# Altium footprint library L14.PcbLib: 12 footprints
Each footprint in its own frame and in the unit in brackets; x right, y up, seen from the top. Pads: shape width x height; smd on the part's side, far side on the other; paste and mask are expansions set on the pad; w line width, h text height; cw(c..) or ccw(c..) is an arc to the next point about the centre after c.
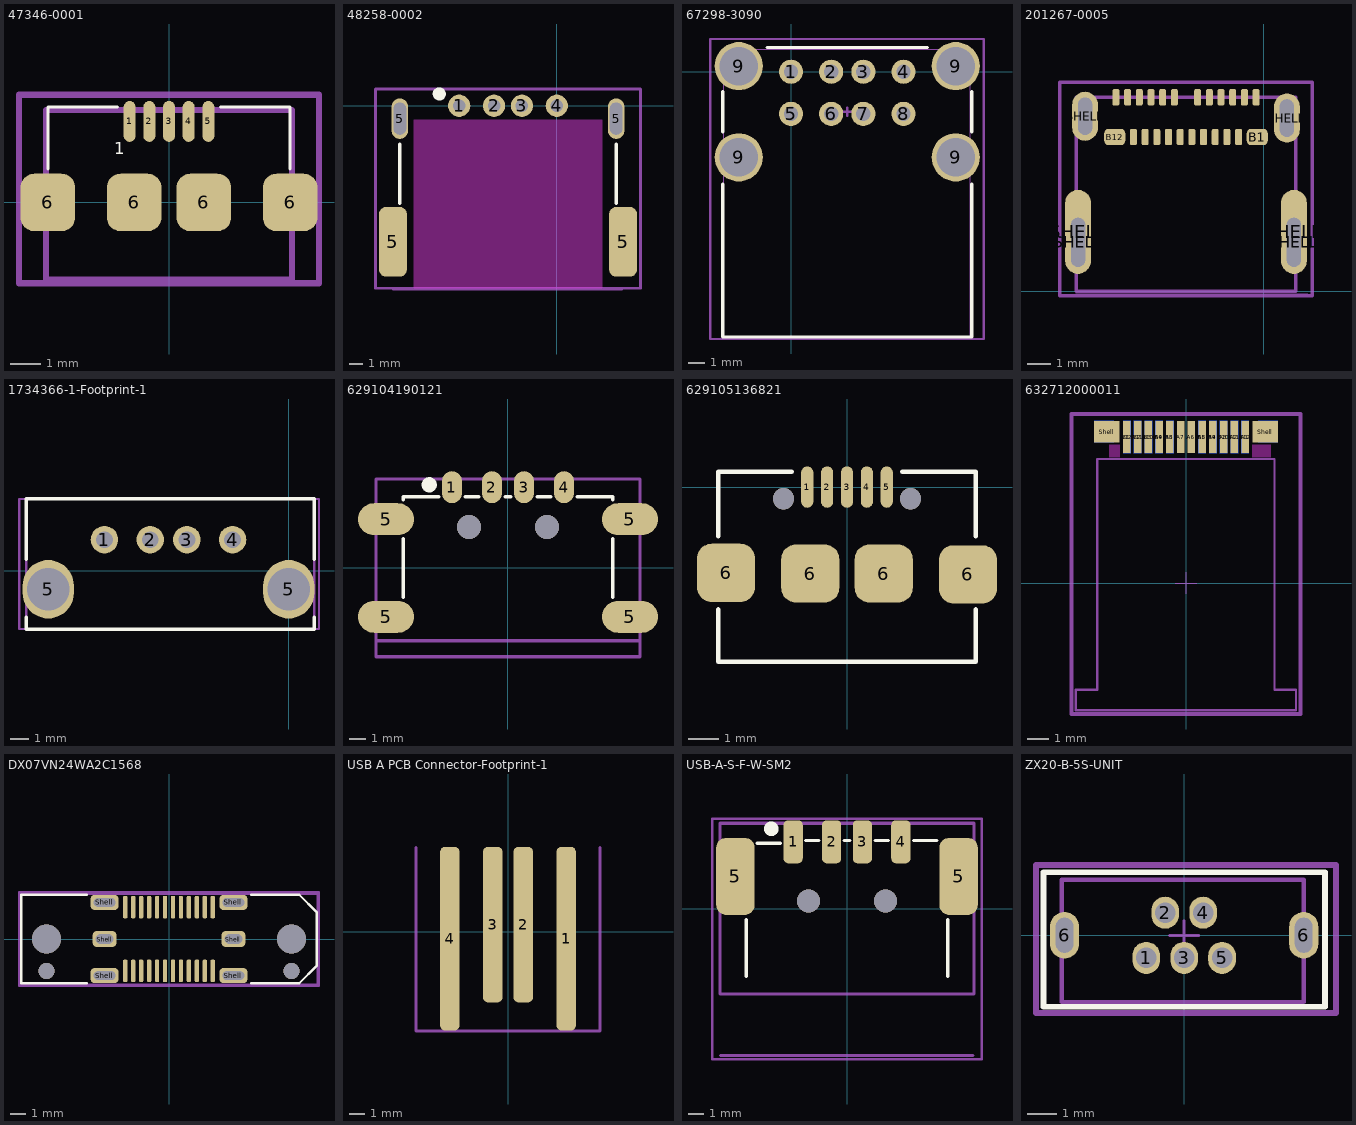
[diagram p0: the footprints below, top view; thin cyan lines are the x and y axes]

## 47346-0001 [mm] "Micro USB 5 pin"
pads (9):
  oval 0.4x1.35 smd paste+0 mask+0: 1(-1.3,2.675) 5(1.3,2.675)
  oval 0.4x1.35 smd paste+0 mask+0.05: 2(-0.65,2.675) 3(0,2.675) 4(0.65,2.675)
  rrect50% 1.8x1.9 smd mask+0: 6(-4,0) 6(-1.15,0) 6(1.15,0) 6(4,0)
Top Overlay:
  lines w0.1: -4,1.1 -4,3.15 -1.7,3.15 ; 1.7,3.15 4,3.15 4,1.1
  text "1" at -1.8,1.6 h0.4
Mechanical 2:
  lines w0.2: -4.064,-2.54 -4.064,3.048 4.064,3.048 4.064,-2.54 -4.064,-2.54
Mechanical 4:
  lines w0.2: -4.953,-2.667 -4.953,3.556 4.953,3.556 4.953,-2.667 2.032,-2.667 -4.953,-2.667
3D body "473460001.stp": height 2.67, standoff -0.27, extent -3.99,-2.526 3.99,2.904

## 48258-0002 [mm] "USB A Midmount THT"
pads (8):
  round 1.6 hole 0.9: 1(-7,0) 2(-4.5,0) 3(-2.5,0) 4(0,0)
  rrect50% 2x5 smd mask+0: 5(-11.75,-9.75) 5(4.75,-9.75)
  oval 1.2x2.9 hole 2.3 slot 0.9 at 0 deg: 5(-11.25,-0.925) 5(4.25,-0.925)
Top Overlay:
  circle w0.5: c-8.424,0.845 r0.224
  lines w0.254: -11.25,-7 -11.25,-2.75 ; 4.25,-7 4.25,-2.75
Keep-Out Layer:
  board cut-out: -10.25,-1 3.25,-1 3.25,-13.075 -10.25,-13.075
Mechanical 14:
  lines w0.2: -13,-13.075 -13,1.205 6,1.205 6,-13.075 -13,-13.075
Mechanical 15:
  lines w0.2: -11.725,-13.139 4.675,-13.139
  text "PCB Edge" at -5.5,-13.089 h1
3D body "482580002.stp": height 4.27, standoff -2.63, extent -12.1,-13.075 5,0.925

## 67298-3090 [mm]
pads (12):
  round 1.5 hole 0.9: 1(0,0) 2(2.5,0) 3(4.5,0) 4(7,0) 5(0,-2.62) 6(2.5,-2.62) 7(4.5,-2.62) 8(7,-2.62)
  round 3 hole 2.4: 9(-3.247,-5.33) 9(-3.247,0.35) 9(10.247,-5.33) 9(10.247,0.35)
Top Overlay:
  lines w0.2: -4.25,-7 -4.25,-16.5 11.25,-16.5 11.25,-7 ; -4.25,-3.75 -4.25,-1.25 ; -1.5,1.5 8.5,1.5 ; 11.25,-3.75 11.25,-1.25
Mechanical 13:
  lines w0.051: -4.197,-16.455 -4.197,1.401 11.153,1.401 11.153,-16.455 -4.197,-16.455
Mechanical 15:
  lines w0.127: 3.246,-2.49 3.754,-2.49 ; 3.5,-2.744 3.5,-2.236 ; -5.025,-16.633 -5.025,2.036 11.993,2.036 11.993,-16.633 -5.025,-16.633
Mechanical 17:
  text "'.Designator'" at -1.143,-0.127 h0.2
  text "'.Designator'" at -2.125,-9.875 h1
3D body "672983090.stp": height 16.17, standoff -2.98, extent -4.178,-16.459 11.146,1.401

## 201267-0005 [mm] "USB 3.1 C Right Angle"
height 3
pads (30):
  rrect50% 0.3x0.7 smd mask+0.07: A1(-6.325,8.3) A2(-5.825,8.3) A3(-5.325,8.3) A4(-4.825,8.3) A5(-4.325,8.3) A6(-3.825,8.3) A7(-2.825,8.3) A8(-2.325,8.3) A9(-1.825,8.3) A10(-1.325,8.3) A11(-0.825,8.3) A12(-0.325,8.3) B2(-1.075,6.6) B3(-1.575,6.6) B4(-2.075,6.6) B5(-2.575,6.6) B6(-3.075,6.6) B7(-3.575,6.6) B8(-4.075,6.6) B9(-4.575,6.6) B10(-5.075,6.6) B11(-5.575,6.6)
  rrect50% 0.9x0.7 smd mask+0.07: B1(-0.275,6.6) B12(-6.375,6.6)
  oval 1.1x2.7 hole 0.6 slot 2.1 at 90 deg mask+0.07: SHELL(-7.945,2.09) SHELL(1.295,2.09)
  oval 1.1x3.6 all layers, no hole mask+0.07: SHELL(-7.945,2.54) SHELL(1.295,2.54)
  oval 1.1x2.1 hole 0.6 slot 1.6 at 90 deg mask+0.07: SHELL(-7.645,7.49) SHELL(0.995,7.41)
Mechanical 1:
  lines w0.15: -8.025,-0.18 1.875,-0.18
Mechanical 2:
  lines w0.15: -8.025,0 -8.025,6 -8.025,8.3 1.375,8.3 1.375,0 -8.025,0
Mechanical 4:
  lines w0.15: -8.725,-0.2 2.075,-0.2 2.075,8.95 1.8,8.95 -8.725,8.95 -8.725,-0.2
3D body "2012670005.stp": height 3.71, standoff -2.3, extent -8.02,0 1.37,8.3

## 1734366-1-Footprint-1 [mm]
pads (6):
  round 1.5 hole 0.92: 1(-10.07,1.71) 2(-7.57,1.71) 3(-5.57,1.71) 4(-3.07,1.71)
  oval 2.8x3.2 hole 2.3: 5(-13.14,-1) 5(0,-1)
Top Overlay:
  lines w0.2: -14.351,-2.54 -14.351,-3.175 1.397,-3.175 1.397,-2.54 ; -14.351,0.635 -14.351,3.937 1.397,3.937 1.397,0.635
Mechanical 13:
  lines w0.127: -14.351,-3.175 1.397,-3.175 1.397,3.937 -14.351,3.937 -14.351,-3.175
Mechanical 15:
  lines w0.127: -14.732,-3.175 -14.732,3.937 1.651,3.937 1.651,-3.175 -14.732,-3.175
Mechanical 17:
  text "'.Designator'" at -12.065,-0.889 h1
3D body "c-1734366-1-c1-3d.stp": height 15, standoff -3.93, extent -14.376,-3.179 1.423,3.941

## 629104190121 [mm]
pads (8):
  oval 1.25x2 smd mask+0: 1(-3.5,5.045) 4(3.5,5.045)
  oval 1.25x2 smd mask+0.05: 2(-1,5.045) 3(1,5.045)
  oval 3.5x2 smd mask+0: 5(-7.625,-3.055) 5(-7.625,3.045) 5(7.625,-3.055) 5(7.625,3.045)
via 2.45,2.545 diameter 1.5 hole 1.5
via -2.45,2.545 diameter 1.5 hole 1.5
Top Overlay:
  circle w0.5: c-4.924,5.195 r0.224
  lines w0.2: -6.55,-1.855 -6.55,1.845 ; -6.55,4.245 -6.55,4.445 -4.32,4.445 ; -2.68,4.445 -1.82,4.445 ; -0.18,4.445 0.18,4.445 ; 1.82,4.445 2.68,4.445 ; 4.32,4.445 6.55,4.445 6.55,4.245 ; 6.55,-1.855 6.55,1.845
Mechanical 14:
  lines w0.2: -8.25,-5.555 8.25,-5.555 8.25,5.555 -8.25,5.555 -8.25,-5.555
Mechanical 15:
  lines w0.2: -8.25,-4.555 8.25,-4.555
  text "PCB Edge" at -2,-4.155 h1
3D body "STEP-629104190121-rev1.stp": height 6.37, standoff -0.1, extent -8.25,-5.555 8.25,5.554

## 629105136821 [mm]
pads (9):
  oval 0.4x1.35 smd: 1(-1.3,0) 2(-0.65,0) 3(0,0) 4(0.65,0) 5(1.3,0)
  rrect50% 1.9x1.9 smd: 6(-3.95,-2.8) 6(-1.2,-2.825) 6(1.2,-2.825) 6(3.95,-2.85)
via 2.075,-0.375 diameter 0.7 hole 0.7
via -2.075,-0.375 diameter 0.7 hole 0.7
Top Overlay:
  lines w0.15: -4.2,-4 -4.2,-5.7 4.2,-5.7 4.2,-4 ; -4.2,-1.6 -4.2,0.5 -4.1,0.5 -1.8,0.5 ; 1.8,0.5 4.1,0.5 4.2,0.5 4.2,-1.6
3D body "629105136821 (rev1).stp": height 2.67, standoff -0.63, extent -4,-5.578 4,0.325

## 632712000011 [mm] "USB 3.1 Type C Plug Horizontal SMT"
pads (26):
  rect 0.35x1.5 smd: A1(2.75,6.8) A2(2.25,6.8) A3(1.75,6.8) A4(1.25,6.8) A5(0.75,6.8) A6(0.25,6.8) A7(-0.25,6.8) A8(-0.75,6.8) A9(-1.25,6.8) A10(-1.75,6.8) A11(-2.25,6.8) A12(-2.75,6.8)
  rect 0.35x1.5 smd far side: B1(-2.75,6.8) B2(-2.25,6.8) B3(-1.75,6.8) B4(-1.25,6.8) B5(-0.75,6.8) B8(0.75,6.8) B9(1.25,6.8) B10(1.75,6.8) B11(2.25,6.8) B12(2.75,6.8)
  rect 0.9x1 smd far side: Shell(-3.825,7.05) Shell(3.825,7.05)
  rect 1.18x1 smd: Shell(-3.69,7.05) Shell(3.69,7.05)
Keep-Out Layer:
  board cut-out: 3.075,5.85 3.075,6.45 3.945,6.45 3.945,5.85
  board cut-out: -3.58,5.85 -3.58,6.45 -3.08,6.45 -3.08,5.85
Mechanical 13:
  lines w0.1: -5.135,-5.92 5.115,-5.92 5.115,-4.97 4.115,-4.97 4.115,5.78 -4.135,5.78 -4.135,-4.97 -5.135,-4.97 -5.135,-5.92
Mechanical 15:
  lines w0.05: -0.5,0 0.5,0 ; 0,-0.5 0,0.5
  lines w0.2: 4.953,7.874 5.334,7.874 5.334,-5.334 5.334,-6.096 -5.334,-6.096 -5.334,7.874 5.207,7.874
3D body "632712000011.stp": height 1.64, standoff -2.56, extent -5.135,-5.92 5.115,7.48

## DX07VN24WA2C1568 [mm] "USB Connector Vertical Plug 2 row SMT"
pads (30):
  rrect50% 0.27x1.4 smd mask+0.07: A1(2.75,2) A2(2.25,2) A3(1.75,2) A4(1.25,2) A5(0.75,2) A6(0.25,2) A7(-0.25,2) A8(-0.75,2) A9(-1.25,2) A10(-1.75,2) A11(-2.25,2) A12(-2.75,2) B1(-2.75,-2) B2(-2.25,-2) B3(-1.75,-2) B4(-1.25,-2) B5(-0.75,-2) B6(-0.25,-2) B7(0.25,-2) B8(0.75,-2) B9(1.25,-2) B10(1.75,-2) B11(2.25,-2) B12(2.75,-2)
  rrect50% 1.75x0.95 hole 0.55 slot 1.35 at 0 deg mask+0.07: Shell(-4.05,-2.3) Shell(-4.05,2.3) Shell(4.05,-2.3) Shell(4.05,2.3)
  rrect50% 1.5x1 hole 0.6 slot 1.1 at 0 deg mask+0.07: Shell(-4.05,0) Shell(4.05,0)
via 7.7,0 diameter 1.8 hole 1.8
via -7.7,0 diameter 1.8 hole 1.8
via 7.7,-2 diameter 1 hole 1
via -7.7,-2 diameter 1 hole 1
Top Overlay:
  lines w0.15: -5.16,-2.78 -8.62,-2.78 -9.28,-2.78 -9.28,2.78 -5.16,2.78 ; 5.16,-2.78 8.19,-2.78 9.28,-1.69 9.28,1.69 8.19,2.78 5.16,2.78
Mechanical 4:
  lines w0.15: -9.36,-2.86 -9.36,2.85 9.35,2.85 9.35,-2.86 -9.36,-2.86
Mechanical 6:
  lines w0.15: -9.43,-2.93 -9.43,2.93 9.43,2.93 9.43,-2.93 -9.43,-2.93
3D body "K3D-DX07VN24WA2-V2_JAE_Proprietary.SLDPRT": height 12.59, standoff -1.21, extent -9.2,-2.7 9.2,2.7

## USB A PCB Connector-Footprint-1 [mm]
pads (4):
  rrect50% 1.27x12 smd: 1(3.8,-0.46) 4(-3.8,-0.46)
  rrect50% 1.27x10.16 smd: 2(1,0.46) 3(-1,0.46)
Mechanical 1:
  lines w0.2: -6,5.5 -6,-6.5 6,-6.5 6,5.5

## USB-A-S-F-W-SM2 [mm]
pads (6):
  rrect50% 1.25x2.8 smd mask+0: 1(-3.5,4.35) 4(3.5,4.35)
  rrect50% 1.25x2.8 smd mask+0.05: 2(-1,4.35) 3(1,4.35)
  rrect50% 2.5x5 smd mask+0: 5(-7.25,2.1) 5(7.25,2.1)
via 2.5,0.5 diameter 1.5 hole 1.5
via -2.5,0.5 diameter 1.5 hole 1.5
Top Overlay:
  circle w0.5: c-4.924,5.195 r0.224
  lines w0.2: -6.55,-4.395 -6.55,-0.695 ; -5.842,4.255 -4.32,4.255 ; -2.68,4.445 -1.82,4.445 ; -0.18,4.445 0.18,4.445 ; 1.82,4.445 2.68,4.445 ; 4.32,4.445 5.842,4.445 ; 6.55,-4.395 6.55,-0.695
Mechanical 2:
  lines w0.2: -8.225,-9.539 8.175,-9.539 ; -8.25,-5.555 -8.25,5.555 8.25,5.555 8.25,-5.555 -8.25,-5.555
  text "PCB Edge" at -2,-9.489 h1
Mechanical 4:
  lines w0.15: -8.763,-9.779 -8.763,5.842 -8.509,5.842 8.763,5.842 8.763,-9.779 -8.763,-9.779
3D body "USB-A-S-F-W-SM2.stp": height 7.8, standoff -1.1, extent -8.2,-9.55 8.2,5.45

## ZX20-B-5S-UNIT [mm]
pads (7):
  oval 0.95x1.1 hole 0.7 mask+0.07: 1(-1.3,-0.775) 2(-0.65,0.775) 3(0,-0.775) 4(0.65,0.775) 5(1.3,-0.775)
  oval 1x1.6 hole 0.6 slot 1.2 at 90 deg mask+0.07: 6(-4.1,0) 6(4.1,0)
Top Overlay:
  lines w0.2: -4.826,-1.778 -4.826,-2.45 ; -4.826,-2.45 -4.826,2.159 4.826,2.159 4.826,-2.45 4.064,-2.45 -4.826,-2.45
Mechanical 13:
  lines w0.15: -4.191,-2.286 4.1,-2.286 4.1,1.905 -4.191,1.905 -4.191,-2.286
Mechanical 15:
  lines w0.1: -0.5,0 0.5,0 ; 0,-0.5 0,0.5
  lines w0.2: -5.08,-2.667 5.207,-2.667 5.207,2.413 -5.08,2.413 -5.08,-2.667
Mechanical 17:
  text ".Designator" at -2.413,-0.127 h1
3D body "ZX20-B-5S.stp": height 12.2, standoff -1.4, extent -4.2,-2.3 4.2,2.1